# Altium integrated library Capacitor.IntLib: 1 symbol
Pins are listed as number, name and electrical type; pins without a type are passive.

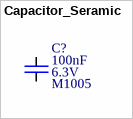
[diagram p0: symbol Capacitor_Seramic]

## Capacitor_Seramic
designator C?  value 100nF  Package: M1005  Rated Voltage: 6.3V  (hidden comment: *)
Manufacturer Part Number: 04026D104KAT4A; Manufacturer: KYOCERA AVX; Tolerance: ±10%; Component Category: Capacitor; Temperature Coefficient: X5R; ComponentLink1Description: Datasheet; ComponentLink1URL: C:\Users\Public\Documents\Altium\env\Datasheets\Capacitor\Kyocera X5R Ceramic.pdf; ComponentLink2Description: Supplier Link; ComponentLink2URL: https://www.digikey.com/en/products/detail/kyocera-avx/04026D104KAT4A/8107673; Supplier Part Number: 478-11504-1-ND; Supplier Link: https://www.digikey.com/en/products/detail/kyocera-avx/04026D104KAT4A/8107673; Supplier Currency: $; Supplier: Digikey; Quantity, Min: 1; Quantity, Max: 50,000; Price, Min: $0.08000; Price, Max: $0.00240; Operating Temperature, Min: -55℃; Operating Temperature, Max: +85℃; Component Type: Ceramic
footprint Capacitor_Seramic_M603_I0201 (Capacitor, Seramic, M603, I0201)
footprint Capacitor_Seramic_M1005_I0402 (Capacitor, Seramic, M1005, I0402)
footprint Capacitor_Seramic_M1608_I0603 (Capacitor, Seramic, M1608, I0603)
footprint Capacitor_Seramic_M3216_I1206 (Capacitor, Seramic, M3216, I1206)
footprint Capacitor_Seramic_M3225_I1210 (Capacitor, Seramic, M3225, I1210)
footprint Capacitor_Seramic_M3246_I1812 (Capacitor, Seramic, M3246, I1812)
footprint Capacitor_Seramic_M5025_I2010 (Capacitor, Seramic, M5025, I2010)
footprint Capacitor_Seramic_M6332_I2512 (Capacitor, Seramic, M1332, I2512)
footprint Capacitor_Seramic_M2012_I0805 (Capacitor, Seramic, M2012, I0805)
pins: 1, 2